# Altium footprint library Basal.PcbLib: 248 footprints (part 13 of 16)
Each footprint in its own frame and in the unit in brackets; x right, y up, seen from the top. Pads: shape width x height; smd on the part's side, far side on the other; paste and mask are expansions set on the pad; w line width, h text height; cw(c..) or ccw(c..) is an arc to the next point about the centre after c.
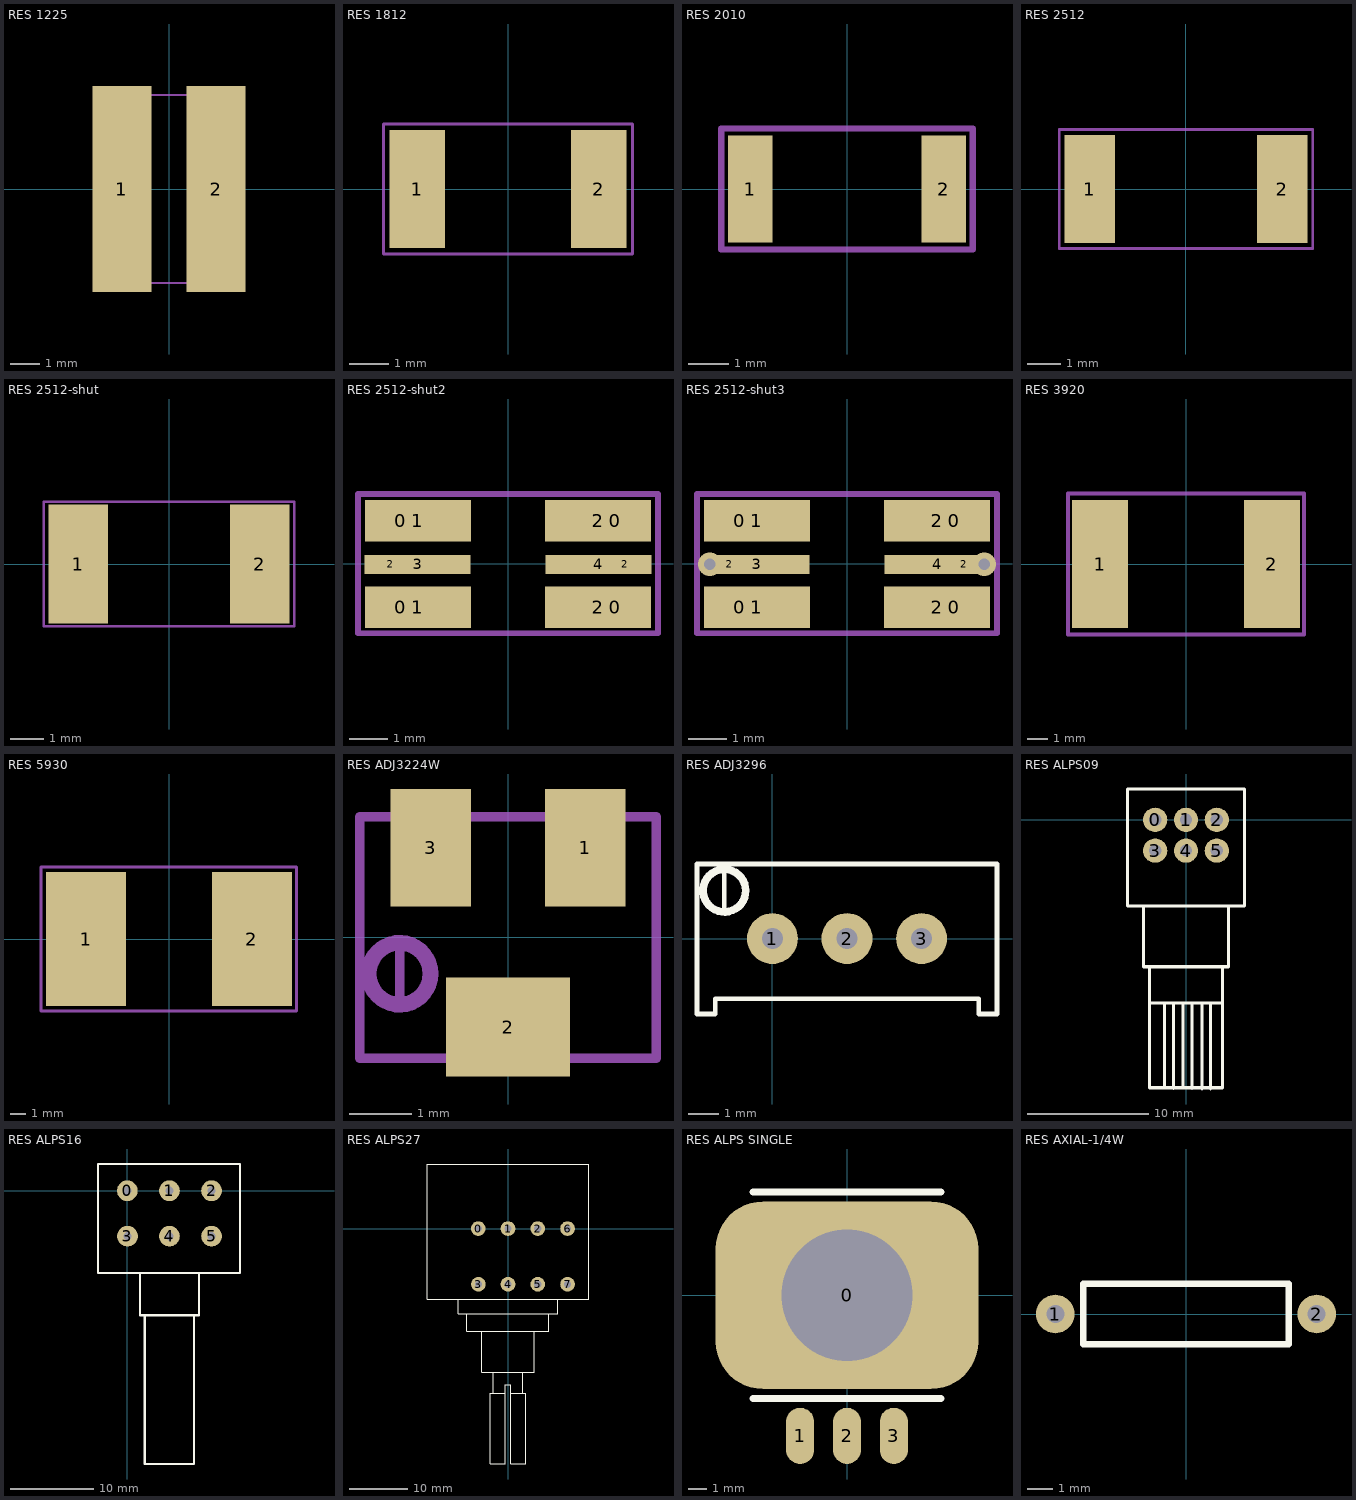
[diagram p12: the footprints below, top view; thin cyan lines are the x and y axes]

## RES 1225 [mm] "贴片电阻1225封装"
height 0.6
pads (2):
  rect 2x7 smd paste-3.048: 1(-1.6,0) 2(1.6,0)
Top Paste:
  drawing of 17 lines, arcs and shapes, not listed
Mechanical 15:
  lines w0.076: -1.6,-3.2 1.6,-3.2 1.6,3.2 -1.6,3.2 -1.6,-3.2
3D body "R1225.STEP": height 0.6, standoff -0.01, extent -1.55,-3.15 1.55,3.15

## RES 1812 [mm] "贴片电阻1812封装"
height 0.5
pads (2):
  rect 1.4x3 smd: 1(-2.3,0) 2(2.3,0)
Mechanical 15:
  lines w0.076: -3.15,-1.651 3.15,-1.651 3.15,1.651 -3.15,1.651 -3.15,-1.651
3D body "R1812.STEP": height 0.6, standoff 0, extent -2.244,-1.6 2.256,1.6

## RES 2010 [mm] "贴片电阻2010封装"
height 0.6
pads (2):
  rect 1.1x2.65 smd: 1(-2.4,0) 2(2.4,0)
Mechanical 15:
  lines w0.152: 1.727,-1.499 3.124,-1.499 3.124,1.499 1.803,1.499 -3.124,1.499 -3.124,-1.499 2.235,-1.499
3D body "R2010.STEP": height 0.62, standoff 0, extent -2.476,-1.244 2.527,1.245

## RES 2512 [mm] "贴片电阻2512封装"
height 0.6
pads (2):
  rect 1.5x3.2 smd paste-3.048: 1(-2.85,0) 2(2.85,0)
Top Paste:
  drawing of 4 lines, arcs and shapes, not listed
Mechanical 15:
  lines w0.076: -3.759,-1.765 -3.759,1.765 3.759,1.765 3.759,-1.765 -3.759,-1.765
3D body "R2512.STEP": height 0.62, standoff 0, extent -3.15,-1.6 3.15,1.6

## RES 2512-shut [mm] "贴片电阻2512封装"
height 0.6
pads (2):
  rect 1.8x3.6 smd paste-3: 1(-2.75,0) 2(2.75,0)
Top Paste:
  drawing of 4 lines, arcs and shapes, not listed
Mechanical 15:
  lines w0.076: -3.797,-1.892 3.797,-1.892 3.797,1.892 -3.797,1.892 -3.797,-1.892
3D body "R2512-3.STEP": height 1.6, standoff 0, extent -3.175,-1.5 3.175,1.5

## RES 2512-shut2 [mm] "贴片电阻2512封装"
height 0.6
pads (12):
  rrect50% 1.73x0.95 on Top Paste: 0(-2.812,-1.143) 0(-2.812,1.125) 0(2.812,-1.143) 0(2.812,1.125)
  rect 2.785x1.1 smd paste-3: 1(-2.367,-1.143) 1(-2.367,1.125) 2(2.367,-1.143) 2(2.367,1.125)
  rrect50% 1.2x0.35 on Top Paste: 2(-3.082,-0.018) 2(3.082,-0.018)
  rect 2.785x0.5 smd paste-3: 3(-2.374,-0.018) 4(2.374,-0.018)
Mechanical 15:
  lines w0.152: -3.937,-1.829 3.937,-1.829 3.937,1.829 -3.937,1.829 -3.937,-1.829
3D body "R2512-3.STEP": height 1.6, standoff 0, extent -3.175,-1.5 3.175,1.5

## RES 2512-shut3 [mm] "贴片电阻2512封装"
height 0.6
pads (12):
  rrect50% 1.73x0.95 on Top Paste: 0(-2.812,-1.143) 0(-2.812,1.125) 0(2.812,-1.143) 0(2.812,1.125)
  rect 2.785x1.1 smd paste-3: 1(-2.367,-1.143) 1(-2.367,1.125) 2(2.367,-1.143) 2(2.367,1.125)
  rrect50% 1.2x0.35 on Top Paste: 2(-3.082,-0.018) 2(3.082,-0.018)
  rect 2.785x0.5 smd paste-3: 3(-2.374,-0.018) 4(2.374,-0.018)
via -3.6,-0.018 diameter 0.61 hole 0.305
via 3.6,-0.018 diameter 0.61 hole 0.305
Mechanical 15:
  lines w0.152: -3.937,-1.829 3.937,-1.829 3.937,1.829 -3.937,1.829 -3.937,-1.829
3D body "R2512-3.STEP": height 1.6, standoff 0, extent -3.175,-1.5 3.175,1.5

## RES 3920 [mm]
pads (2):
  rect 2.7x6.2 smd paste-5: 1(-4.15,0) 2(4.15,0)
Top Paste:
  drawing of 5 lines, arcs and shapes, not listed
Mechanical 15:
  lines w0.2: -5.7,-3.4 -5.7,3.4 5.7,3.4 5.7,-3.4 -5.7,-3.4
3D body "CSS2H-3920.stp": height 0.99, standoff 0, extent -5.022,-2.6 5.022,2.6

## RES 5930 [mm]
pads (2):
  rect 5.2x8.75 smd paste-5: 1(-5.4,0) 2(5.4,0)
Top Paste:
  drawing of 28 lines, arcs and shapes, not listed
Mechanical 15:
  lines w0.2: -8.331,4.7 -8.331,-4.7 8.3,-4.7 8.3,4.7 -8.3,4.7
3D body "CSS2H-5930.stp": height 1.04, standoff 0, extent -7.491,-3.875 7.491,3.875

## RES ADJ3224W [mm]
pads (3):
  rect 1.3x1.9 smd: 1(1.25,1.45) 3(-1.25,1.45)
  rect 2x1.6 smd: 2(0,-1.45)
Mechanical 15:
  circle w0.254: c-1.753,-0.586 r0.5
  lines w0.152: -1.753,-1.094 -1.753,-0.104 ; -2.4,-1.95 -2.4,1.95 2.4,1.95 2.4,-1.95 -2.4,-1.95
3D body "3224W-Vishay.STEP": height 5.3, standoff 0, extent -2.4,-1.95 2.4,1.95

## RES ADJ3296 [mm]
pads (3):
  round 1.7 hole 0.7: 1(0,0) 2(2.489,0) 3(4.978,0)
Top Overlay:
  circle w0.254: c-1.6,1.6 r0.711
  lines w0.152: -1.6,0.889 -1.6,2.286 ; -2.515,-2.515 -1.905,-2.515 -1.905,-2.007 6.883,-2.007 6.883,-2.515 7.493,-2.515 7.493,2.489 -2.515,2.489 -2.515,-2.515
3D body "23948_01.STEP": height 11.56, standoff -2.52, extent -2.26,-2.54 7.29,2.286

## RES ALPS09 [mm]
pads (6):
  round 2 hole 1: 0(-2.54,0) 1(0,0) 2(2.54,0) 3(-2.54,-2.54) 4(0,-2.54) 5(2.54,-2.54)
Top Overlay:
  lines w0.254: -3.505,-7.112 -3.505,-12.116 3.505,-12.116 3.505,-7.112 ; -2.997,-15.113 2.997,-15.113 ; -2.997,-12.116 -2.997,-22.098 2.997,-22.098 2.997,-15.113 ; -1.778,-22.098 -1.778,-15.113 ; -1.016,-22.149 -1.016,-15.164 ; -0.254,-22.098 -0.254,-15.113 ; 0.508,-22.149 0.508,-15.164 ; 1.321,-22.2 1.321,-15.215 ; 2.032,-22.2 2.032,-15.215 ; 2.997,-12.116 2.997,-15.113 ; -4.826,-7.112 4.826,-7.112 4.826,2.54 -4.826,2.54 -4.826,-7.112
3D body "User Library-RK09L.step": height 11.55, standoff -3.35, extent -6.124,-22.569 5.972,4.831

## RES ALPS16 [mm]
pads (6):
  round 2.5 hole 1: 0(-0.025,-0.025) 1(5.055,-0.025) 2(10.135,-0.025) 3(0,-5.5) 4(5.055,-5.5) 5(10.135,-5.5)
Top Overlay:
  lines w0.254: 1.499,-9.931 1.499,-15.037 8.611,-15.037 8.611,-9.931 ; 2.083,-15.037 2.083,-32.969 8.026,-32.969 8.026,-15.037 ; -3.556,-9.931 -3.556,3.2 13.564,3.2 13.564,-9.931 -3.556,-9.931

## RES ALPS27 [mm]
pads (8):
  round 2.5 hole 1.2: 0(-5.08,0) 1(0,0) 2(5.08,0) 3(-5.055,-9.5) 4(0,-9.5) 5(5.08,-9.5) 6(10.16,0) 7(10.16,-9.5)
Top Overlay:
  lines w0.152: -8.484,-12.04 -8.484,-14.529 8.484,-14.529 8.484,-12.04 ; -7.061,-14.529 -7.061,-17.526 6.96,-17.526 6.96,-14.58 ; -4.521,-17.526 -4.521,-24.5 4.47,-24.5 4.47,-17.577 ; -2.54,-24.5 -2.54,-28.092 ; -0.508,-28.092 -2.54,-28.092 ; 0.559,-28.092 3.048,-28.092 3.048,-40.183 0.508,-40.183 0.508,-26.67 -0.508,-26.67 -0.508,-40.183 -3.048,-40.183 -3.048,-28.092 -2.54,-28.092 ; 2.54,-28.092 2.54,-24.5 ; -13.767,-12.04 13.767,-12.04 13.767,11.024 -13.767,11.024 -13.767,-12.04
3D body "ALPS RK27.STEP": height 25, standoff -4, extent -13.424,-35.799 13.576,10.601

## RES ALPS SINGLE [mm]
pads (4):
  rrect50% 14x10 hole 7: 0(0,0)
  oval 1.5x3 smd: 1(-2.5,-7.5) 2(0,-7.5) 3(2.5,-7.5)
Top Overlay:
  lines w0.381: -5,-5.5 5,-5.5 ; -5,5.5 5,5.5

## RES AXIAL-1/4W [mm] "400mil间距M型直插电阻封装"
height 2.032
pads (2):
  round 1.5 hole 0.7: 1(-5.08,0) 2(5.08,0)
Top Overlay:
  lines w0.254: -4,-1.168 -4,1.168 4,1.168 4,-1.168 -4,-1.168
3D body "0.25 W.STEP": height 2.93, standoff -2.54, extent -5.385,-1.156 5.385,1.156